# Altium footprint library Other.PcbLib: 104 footprints (part 1 of 7)
Each footprint in its own frame and in the unit in brackets; x right, y up, seen from the top. Pads: shape width x height; smd on the part's side, far side on the other; paste and mask are expansions set on the pad; w line width, h text height; cw(c..) or ccw(c..) is an arc to the next point about the centre after c.
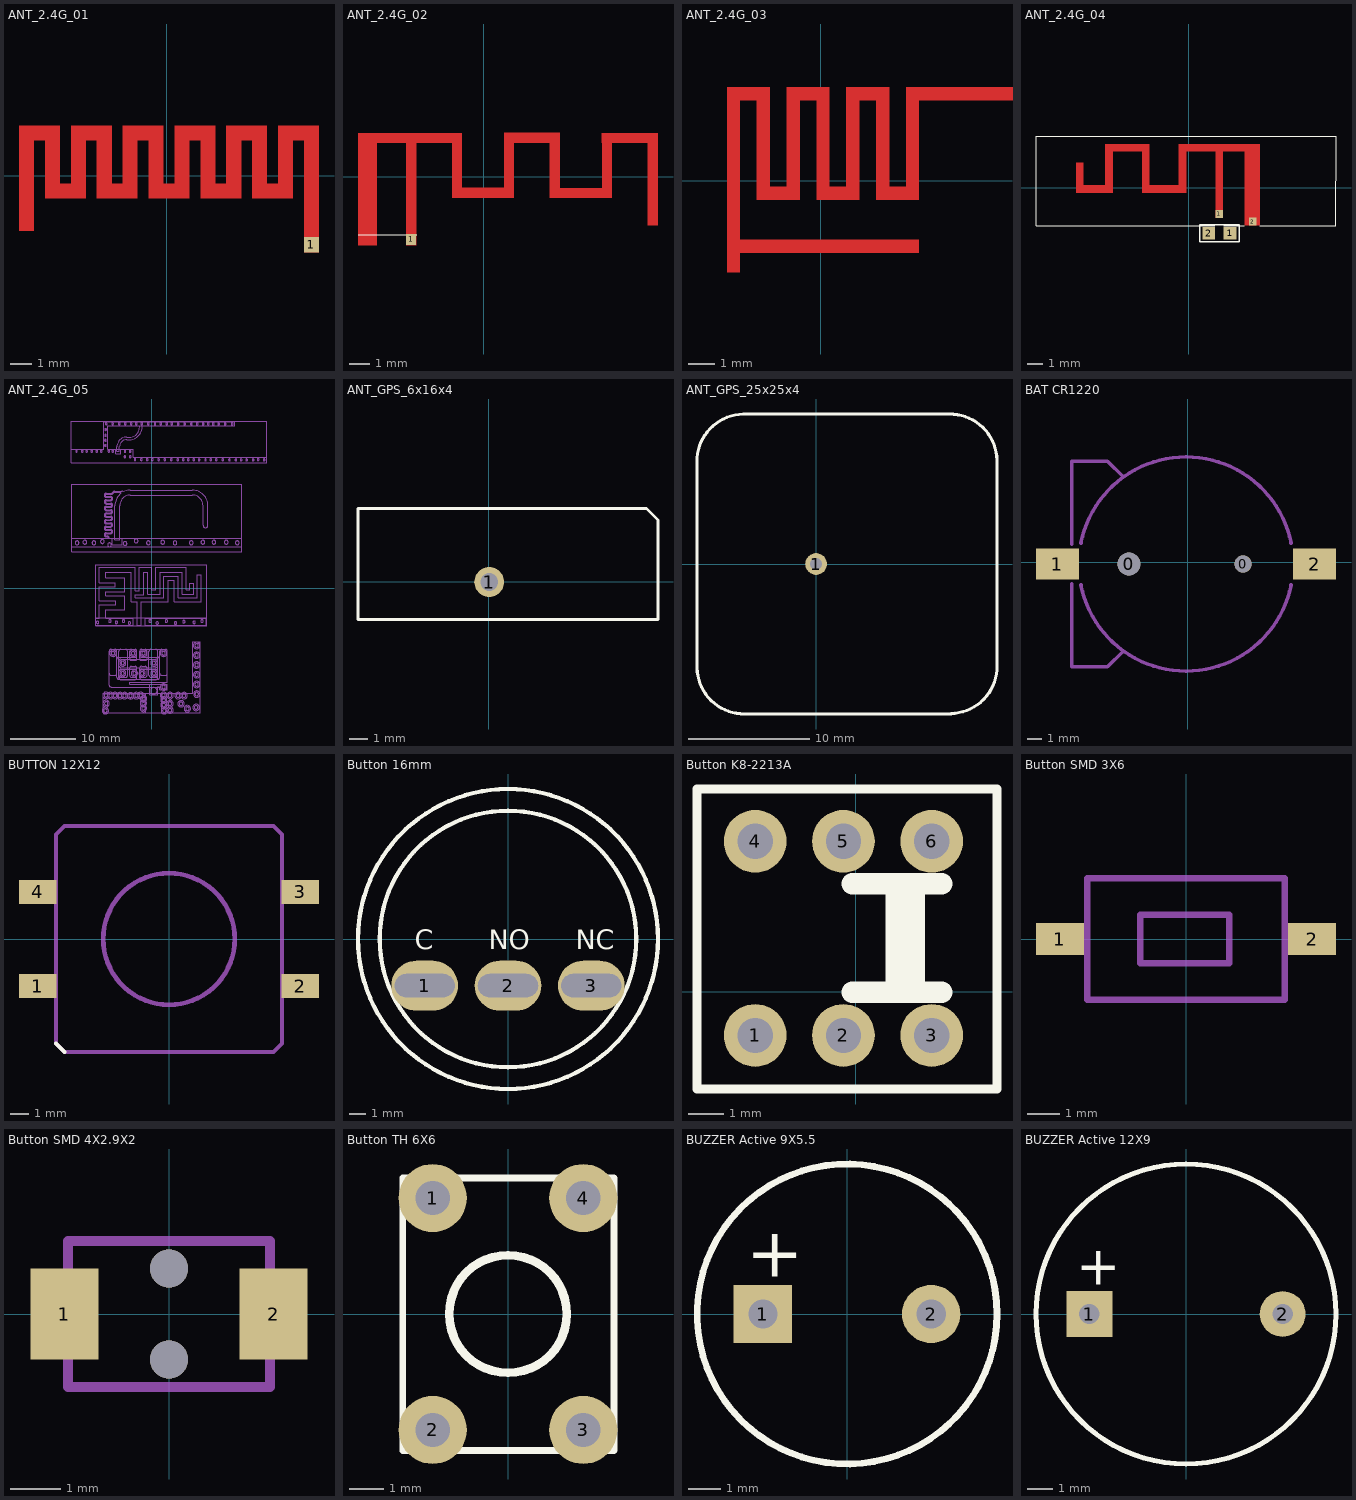
[diagram p0: the footprints below, top view; thin cyan lines are the x and y axes]

## ANT_2.4G_01 [mm] "2.4G"
pads (1):
  rect 0.7x0.7 smd: 1(6.706,-3.2)
Top Layer:
  region: 7.061,-1.067 6.361,-1.067 6.361,-3.567 7.061,-3.567
  region: -6.139,-0.967 -6.839,-0.967 -6.839,-2.567 -6.139,-2.567
  region: -4.939,2.333 -5.639,2.333 -5.639,-1.067 -4.939,-1.067
  region: -5.334,2.333 -6.604,2.333 -6.604,1.633 -5.334,1.633
  region: -6.139,2.333 -6.839,2.333 -6.839,-1.067 -6.139,-1.067
  region: -2.539,2.333 -3.239,2.333 -3.239,-1.067 -2.539,-1.067
  region: -2.743,2.333 -4.216,2.333 -4.216,1.633 -2.743,1.633
  region: -3.739,2.333 -4.439,2.333 -4.439,-1.067 -3.739,-1.067
  region: -4.115,-0.367 -5.258,-0.367 -5.258,-1.067 -4.115,-1.067
  region: -0.139,2.333 -0.839,2.333 -0.839,-1.067 -0.139,-1.067
  region: -0.559,2.333 -1.651,2.333 -1.651,1.633 -0.559,1.633
  region: -1.339,2.333 -2.039,2.333 -2.039,-1.067 -1.339,-1.067
  region: -1.753,-0.367 -2.845,-0.367 -2.845,-1.067 -1.753,-1.067
  region: 2.261,2.333 1.561,2.333 1.561,-1.067 2.261,-1.067
  region: 1.829,2.333 0.813,2.333 0.813,1.633 1.829,1.633
  region: 1.061,2.333 0.361,2.333 0.361,-1.067 1.061,-1.067
  region: 0.711,-0.367 -0.432,-0.367 -0.432,-1.067 0.711,-1.067
  region: 4.661,2.333 3.961,2.333 3.961,-1.067 4.661,-1.067
  region: 4.267,2.333 3.15,2.333 3.15,1.633 4.267,1.633
  region: 3.461,2.333 2.761,2.333 2.761,-1.067 3.461,-1.067
  region: 3.2,-0.367 1.829,-0.367 1.829,-1.067 3.2,-1.067
  region: 5.588,-0.367 4.216,-0.367 4.216,-1.067 5.588,-1.067
  region: 5.861,2.333 5.161,2.333 5.161,-1.067 5.861,-1.067
  region: 6.756,2.333 5.385,2.333 5.385,1.633 6.756,1.633
  region: 7.061,2.333 6.361,2.333 6.361,-1.956 7.061,-1.956

## ANT_2.4G_02 [mil] "2.4G"
pads (1):
  rect 19x20 smd: 1(-137.34,-118.98)
Top Layer:
  rectangle: -237.89,-129.89 -202.46,63.02
  rectangle: -237.89,63.02 -41.04,82.71
  rectangle: -147.34,-129.89 -127.65,63.02
  rectangle: -60.72,-40.91 -41.04,63.02
  rectangle: -41.04,-40.91 37.7,-21.23
  rectangle: 37.7,-40.91 57.39,63.02
  rectangle: 37.7,63.02 144,82.71
  rectangle: 124.31,-40.91 144,63.02
  rectangle: 144,-40.91 222.74,-21.23
  rectangle: 222.74,-40.91 242.43,63.02
  rectangle: 222.74,63.02 329.04,82.71
  rectangle: 309.35,-92.09 329.04,63.02
Top Overlay:
  lines w1: -237.89,-110.2 -126.67,-110.2

## ANT_2.4G_03 [mm] "2.4G"
Top Layer:
  region: -0.812,-0.724 -0.812,-0.216 -2.463,-0.216 -2.463,-0.724
  rectangle: -3.606,-3.518 -3.098,3.594
  region: -1.955,3.086 -1.955,3.594 -3.606,3.594 -3.606,3.086
  rectangle: -2.463,-0.724 -1.955,3.213
  region: -0.812,3.213 -1.32,3.213 -1.32,-0.724 -0.812,-0.724
  region: 0.331,3.086 0.331,3.594 -1.32,3.594 -1.32,3.086
  region: 0.331,3.594 -0.177,3.594 -0.177,-0.343 0.331,-0.343
  region: -0.177,-0.216 -0.177,-0.724 1.474,-0.724 1.474,-0.216
  region: 1.474,3.213 0.966,3.213 0.966,-0.724 1.474,-0.724
  region: 2.617,3.086 2.617,3.594 0.966,3.594 0.966,3.086
  region: 2.617,3.594 2.109,3.594 2.109,-0.343 2.617,-0.343
  region: 2.109,-0.216 2.109,-0.724 3.76,-0.724 3.76,-0.216
  region: 3.76,3.213 3.252,3.213 3.252,-0.724 3.76,-0.724
  region: 7.443,3.086 7.443,3.594 3.252,3.594 3.252,3.086
  region: 3.76,-2.756 3.76,-2.248 -3.352,-2.248 -3.352,-2.756

## ANT_2.4G_04 [mil] "2.4G"
pads (4):
  rect 19x20 smd: 1(78.99,-67.49) 2(165.26,-87.09)
  rect 32.5x31.5 smd: 1(106.78,-117.23)
  rect 32.5x32 smd: 2(51.78,-117.23)
Top Layer:
  rectangle: 143.45,-97.86 183.21,102.77
  rectangle: 69.05,-77.46 88.73,101.77
  rectangle: -25.41,92.97 183.21,112.65
  rectangle: -25.41,-1.23 -5.73,104.77
  rectangle: -106.72,-13.33 -5.76,6.35
  rectangle: -119.93,-13.33 -100.25,99.77
  rectangle: -202.72,92.97 -100.22,112.65
  rectangle: -214.43,-5.23 -194.74,112.65
  rectangle: -278.72,-13.33 -194.74,6.34
  rectangle: -290.02,-13.32 -270.35,65.12
Top Overlay:
  lines w0.1: 67.08,-97.86 -392.37,-97.86 -392.37,132.06 379.28,132.06 379.28,-97.86 183.21,-97.86 ; 90.7,-97.86 143.45,-97.86
  lines w3.94: 28.28,-138.88 28.28,-95.57 70.43,-95.57 88.14,-95.57 130.28,-95.57 130.28,-138.88 88.14,-138.88 70.43,-138.88 28.28,-138.88
3D body "User Library-RES_1609-0603.step": height 22.05, standoff 0, extent 45.81,-132.98 112.74,-101.49

## ANT_2.4G_05 [mm] "2.4G"
Mechanical 1:
  circle w0.013: c-1.264,-18.496 r0.5
  circle w0.013: c-1.254,-17.716 r0.5
  circle w0.013: c-1.244,-17.026 r0.5
  circle w0.013: c-1.654,-16.516 r0.5
  circle w0.013: c-2.354,-16.536 r0.5
  circle w0.013: c-3.244,-16.556 r0.5
  circle w0.013: c-4.174,-16.536 r0.5
  circle w0.013: c-4.874,-16.536 r0.5
  circle w0.013: c-5.634,-16.516 r0.5
  circle w0.013: c-6.324,-16.516 r0.5
  circle w0.013: c-7.114,-18.846 r0.5
  circle w0.013: c-7.004,-17.746 r0.5
  circle w0.013: c-7.034,-16.486 r0.5
  circle w0.013: c6.856,-18.356 r0.5
  circle w0.013: c5.006,-16.536 r0.5
  circle w0.013: c4.086,-16.536 r0.5
  circle w0.013: c5.516,-18.546 r0.5
  circle w0.013: c4.536,-17.786 r0.5
  circle w0.013: c1.956,-18.866 r0.5
  circle w0.013: c2.846,-18.786 r0.5
  circle w0.013: c1.876,-17.966 r0.5
  circle w0.013: c1.876,-17.216 r0.5
  circle w0.013: c2.836,-17.766 r0.5
  circle w0.013: c1.856,-16.496 r0.5
  circle w0.013: c2.836,-16.516 r0.5
  circle w0.013: c6.966,-16.306 r0.5
  circle w0.013: c6.946,-14.806 r0.5
  circle w0.013: c6.956,-13.316 r0.5
  circle w0.013: c6.946,-11.806 r0.5
  circle w0.013: c6.956,-10.306 r0.5
  circle w0.013: c6.946,-8.806 r0.5
  circle w0.013: c0.358,-13.106 r0.5
  circle w0.013: c-2.845,-10.006 r0.5
  circle w0.013: c-2.643,-13.103 r0.5
  circle w0.013: c-4.446,-13.105 r0.5
  circle w0.013: c0.361,-11.503 r0.5
  circle w0.013: c-1.442,-13.106 r0.5
  circle w0.013: c1.856,-10.006 r0.5
  circle w0.013: c1.859,-15.207 r0.5
  circle w0.013: c-5.946,-10.005 r0.5
  circle w0.013: c-4.446,-11.503 r0.5
  circle w0.013: c-1.245,-10.004 r0.5
Mechanical 2:
  drawing of 426 lines, arcs and shapes, not listed
Mechanical 3:
  drawing of 231 lines, arcs and shapes, not listed
Mechanical 4:
  lines w0.013: -12.363,19.329 17.737,19.329 17.737,25.739 -12.363,25.739 -12.363,19.329 ; -12.287,6.416 13.913,6.416 13.913,16.016 -12.287,16.016 -12.287,6.416 ; -8.63,-5.739 -8.63,3.661 8.47,3.661 8.47,-5.739 -8.63,-5.739
  text "v" at -1.347,-18.559 h0.13
  text "v" at -1.337,-17.779 h0.13
  text "v" at -1.327,-17.089 h0.13
  text "v" at -1.737,-16.579 h0.13
  text "v" at -2.437,-16.599 h0.13
  text "v" at -3.327,-16.619 h0.13
  text "v" at -4.257,-16.599 h0.13
  text "v" at -4.957,-16.599 h0.13
  text "v" at -5.717,-16.579 h0.13
  text "v" at -6.407,-16.579 h0.13
  text "v" at -7.197,-18.909 h0.13
  text "v" at -7.087,-17.809 h0.13
  text "v" at -7.117,-16.549 h0.13
  text "v" at 6.773,-18.419 h0.13
  text "v" at 4.923,-16.599 h0.13
  text "v" at 4.003,-16.599 h0.13
  text "v" at 5.433,-18.609 h0.13
  text "v" at 4.453,-17.849 h0.13
  text "v" at 1.873,-18.929 h0.13
  text "v" at 2.763,-18.849 h0.13
  text "v" at 1.793,-18.029 h0.13
  text "v" at 1.793,-17.279 h0.13
  text "v" at 2.753,-17.829 h0.13
  text "v" at 1.773,-16.559 h0.13
  text "v" at 2.753,-16.579 h0.13
  text "v" at 6.883,-16.369 h0.13
  text "v" at 6.863,-14.869 h0.13
  text "v" at 6.873,-13.379 h0.13
  text "v" at 6.863,-11.869 h0.13
  text "v" at 6.873,-10.369 h0.13
  text "v" at 6.863,-8.869 h0.13
  text "v" at 0.275,-13.169 h0.13
  text "v" at -2.928,-10.069 h0.13
  text "v" at -2.726,-13.166 h0.13
  text "v" at -4.529,-13.168 h0.13
  text "v" at 0.278,-11.566 h0.13
  text "v" at -1.525,-13.169 h0.13
  text "v" at 1.773,-10.069 h0.13
  text "v" at 1.776,-15.27 h0.13
  text "v" at -6.029,-10.068 h0.13
  text "v" at -4.529,-11.566 h0.13
  text "v" at -1.328,-10.067 h0.13
Mechanical 5:
  drawing of 182 lines, arcs and shapes, not listed

## ANT_GPS_6x16x4 [mm]
pads (1):
  round 1.6 hole 0.95 paste+0 mask+0.05: 1(0.016,-0.009)
Top Overlay:
  lines w0.15: -6.984,-2.009 -6.984,3.912 8.407,3.912 9.016,3.303 9.016,-2.009 -6.984,-2.009
3D body: height 4.1, standoff 0, extent -0.778,-0.808 0.816,0.789
3D body: height 4, standoff 0, extent -6.858,-2.032 8.89,3.81

## ANT_GPS_25x25x4 [mm]
pads (1):
  round 1.8 hole 1 paste+0 mask+0.05: 1(0,0)
Top Overlay:
  lines w0.254: 11.125,-12.344 ccw(c11.062,-8.471) 14.935,-8.407 14.935,8.56 ccw(c11.062,8.496) 10.998,12.37 -6.02,12.37 ccw(c-5.956,8.496) -9.83,8.433 -9.83,-8.56 ccw(c-5.956,-8.496) -5.893,-12.37 11.176,-12.37
3D body "ALSRobot-25mmX25m GPS LAN.step": height 5, standoff -3, extent -9.935,-12.5 15.065,12.5

## BAT CR1220 [mm] "CR1220纽扣电池座"
pads (4):
  round 1.6 hole 1.6: 0(-4.127,-0.127)
  round 1.2 hole 1.2: 0(3.873,-0.127)
  rect 3x2.2 smd: 1(-9.127,-0.127) 2(8.873,-0.127)
Mechanical 15:
  lines w0.254: -8.127,-1.527 -8.127,-7.327 -5.627,-7.327 -4.527,-6.227 ; -8.127,1.273 -8.127,7.073 -5.627,7.073 -4.527,5.973 ; -7.481,-1.598 ccw(c-0.127,-0.127) 7.227,-1.598 ; -7.481,1.344 cw(c-0.127,-0.127) 7.227,1.344
3D body "Battery Holder for CR1220 SMD.STEP": height 4.53, standoff -0.22, extent -9.784,-7.451 9.017,7.298

## BUTTON 12X12 [mm]
pads (4):
  rect 2x1.3 smd: 1(-6.975,-2.5) 2(6.975,-2.5) 3(6.975,2.5) 4(-6.975,2.5)
Top Overlay:
  lines w0.203: -6,-5.557 -5.557,-6
Mechanical 15:
  circle w0.254: c0,0 r3.5
  lines w0.203: -6,5.557 -5.557,6 ; -6,5.557 -5.557,6 ; -6,5.557 -6,-5.557 -5.557,-6 5.557,-6 6,-5.557 6,5.557 ; -5.557,6 5.557,6 ; 5.557,6 6,5.557 ; 5.557,6 6,5.557
3D body: height 0.2, standoff 0, extent 5.652,-3.167 7.811,-1.833
3D body: height 0.2, standoff 0, extent 5.652,1.833 7.811,3.167
3D body: height 0.2, standoff 0, extent -7.81,-3.167 -5.651,-1.833
3D body: height 0.2, standoff 0, extent -7.81,1.833 -5.651,3.167
3D body: height 3.6, standoff 3.3, extent -5.572,3.436 -3.572,5.436
3D body: height 3.6, standoff 3.3, extent 3.572,-5.708 5.572,-3.708
3D body: height 3.6, standoff 3.3, extent -5.572,-5.708 -3.572,-3.708
3D body: height 3.6, standoff 3.3, extent 3.572,3.436 5.572,5.436
3D body: height 3.4, standoff 0.1, extent -6,-6.152 6,5.88
3D body: height 4, standoff 0, extent -3.5,-3.651 3.5,3.347
3D body: height 7.3, standoff 5.3, extent -1.902,-2.052 1.903,1.748
3D body: height 5.5, standoff 3, extent -1.648,-1.802 1.648,1.497

## Button 16mm [mm] "16X32mm圆柱形点动开关"
pads (3):
  oval 4x3 hole 1.4 slot 3.6 at 0 deg: 1(-5,-2.8) 2(0,-2.8) 3(5,-2.8)
Top Overlay:
  circle w0.254: c0,0 r7.7
  circle w0.254: c0,0 r9
  text "C" at -5.588,-1.016 h2.03
  text "NO" at -1.143,-1.016 h2.03
  text "NC" at 4.064,-1.016 h2.03
3D body "Kacon_K16-321R-2.STEP": height 32, standoff -8.91, extent -9.229,-8.898 8.771,9.102

## Button K8-2213A [mil] "六脚自锁按键"
pads (6):
  round 70 hole 39.37: 1(-112.43,-48.54) 2(-14,-48.54) 3(84.43,-48.54) 4(-112.43,168) 5(-14,168) 6(84.43,168)
Top Overlay:
  lines w10: -177.32,-108.32 157.32,-108.32 157.32,226.32 -177.32,226.32 -177.32,-108.32
  lines w24: -4.32,-0.27 95.68,-0.27 ; -4.32,120.36 95.68,120.36 ; 45.06,0.68 45.06,118.79 ; 64.74,0.68 64.74,118.79
3D body "TL 2201.step": height 551.18, standoff -137.8, extent -180.33,-107.58 154.31,227.06

## Button SMD 3X6 [mm] "3X6mm单通贴片按键"
pads (2):
  rect 1.5x1 smd: 1(-3.95,0) 2(3.95,0)
Mechanical 15:
  lines w0.2: -3.1,-1.9 3.1,-1.9 3.1,1.9 -3.1,1.9 -3.1,-1.9 ; -1.435,-0.762 -1.435,0.762 1.359,0.762 1.359,-0.762 -1.435,-0.762
3D body "K_KEY_TP_3X6.STEP": height 2.5, standoff 0, extent -3.088,-1.85 3.012,1.85

## Button SMD 4X2.9X2 [mm]
pads (2):
  rect 1.35x1.8 smd: 1(-2.075,0) 2(2.075,0)
via 0,-0.9 diameter 0.75 hole 0.75
via 0,0.9 diameter 0.75 hole 0.75
Mechanical 15:
  lines w0.2: -2,-1.45 2,-1.45 2,1.45 -2,1.45 -2,-1.45
3D body: height 2, standoff 1.5, extent -0.749,-0.483 0.749,0.483
3D body: height 1.5, standoff 0, extent -2,-1.45 2,1.45
3D body: height 0.1, standoff 0, extent -2.405,-0.62 -1.872,0.62
3D body: height 0.1, standoff 0, extent 1.872,-0.62 2.405,0.62
3D body: height 0, standoff -0.45, extent -0.275,0.625 0.275,1.175
3D body: height 0, standoff -0.45, extent -0.275,-1.175 0.275,-0.625

## Button TH 6X6 [mm] "6X6mm黑色四脚直插按键"
pads (4):
  round 2 hole 1: 1(-2.22,3.407) 2(-2.22,-3.4) 3(2.2,-3.4) 4(2.2,3.407)
Top Overlay:
  circle w0.254: c-0.01,0.004 r1.727
  lines w0.203: -3.1,-4 -3.1,4 3.1,4 3.1,-4 -3.1,-4
3D body "Button TH6X6.STEP": height 7, standoff -3.5, extent -3.1,-3.95 3.1,3.95

## BUZZER Active 9X5.5 [mil] "小号9*5.5mm有源蜂鸣器"
pads (2):
  rect 70x70 hole 35: 1(-101,0)
  round 70 hole 35: 2(101,0)
Top Overlay:
  circle w8: c0,0 r180
  text "+" at -120.99,45 h60
3D body "Buzzer TH9mm.STEP": height 220.47, standoff -212.6, extent -179.12,-179.12 179.14,179.14

## BUZZER Active 12X9 [mm] "大号12mm有源蜂鸣器"
pads (2):
  rect 1.8x1.8 hole 0.8: 1(-3.8,0)
  round 1.8 hole 0.8: 2(3.8,0)
Top Overlay:
  circle w0.203: c0,0 r5.9
  text "+" at -4.308,1.143 h1.52
3D body "Buzzer Active TH12X9.STEP": height 9.5, standoff -4.5, extent -6,-6 6,6